# Altium footprint library 3.22-杂项.PcbLib: 985 footprints (part 40 of 64)
Each footprint in its own frame and in the unit in brackets; x right, y up, seen from the top. Pads: shape width x height; smd on the part's side, far side on the other; paste and mask are expansions set on the pad; w line width, h text height; cw(c..) or ccw(c..) is an arc to the next point about the centre after c.
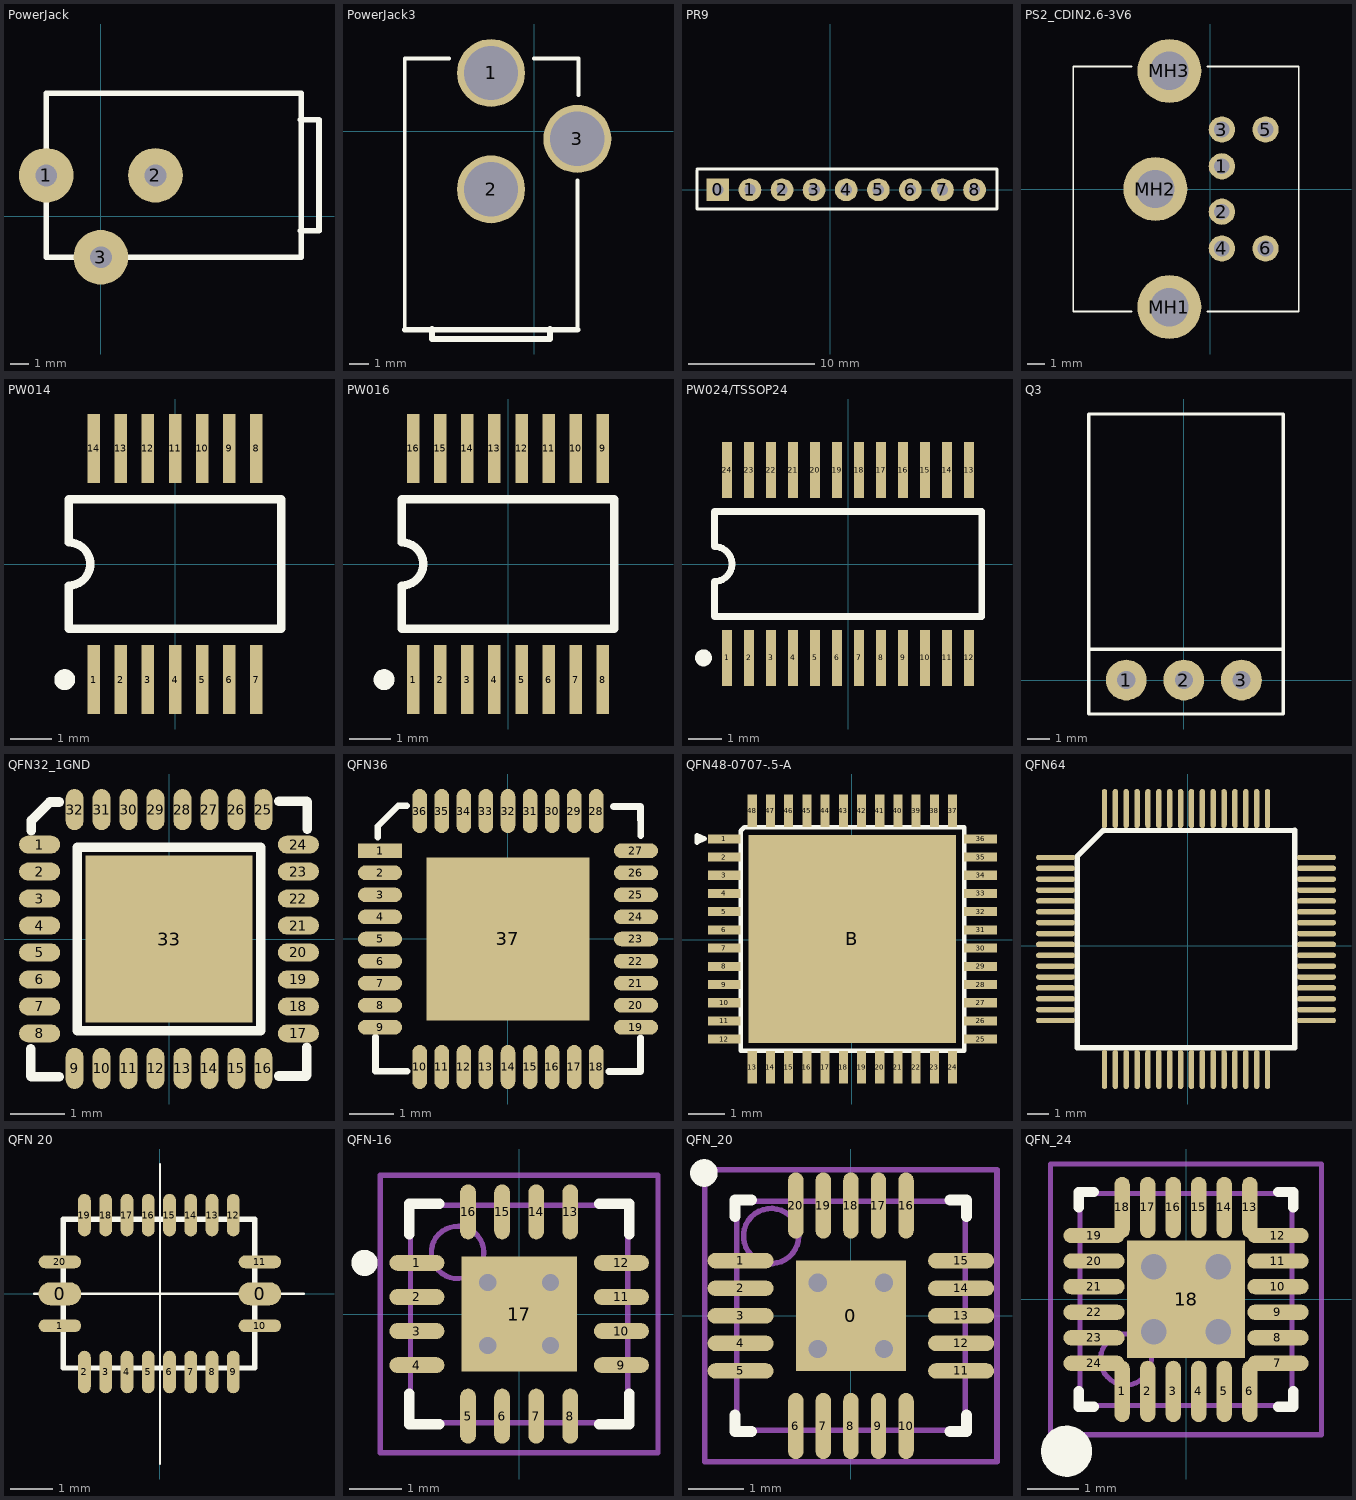
[diagram p39: the footprints below, top view; thin cyan lines are the x and y axes]

## PowerJack [mm] "PowerJack"
pads (3):
  round 3 hole 1.2: 1(-3,2.25) 2(3,2.25) 3(0,-2.25)
Top Overlay:
  lines w0.203: 10.97,0.726 10.97,5.298
  lines w0.305: 10.97,-0.798 11.986,-0.798 11.986,5.298 10.97,5.298 ; -3,-2.25 11,-2.25 11,6.75 -3,6.75 -3,-2.25

## PowerJack3 [mm] "14mm长，8.9mm宽，2.54焊盘，2与3脚相连为-"
pads (3):
  round 3.5 hole 2.8: 1(-2.225,3) 2(-2.225,-3) 3(2.225,-0.4)
Top Overlay:
  lines w0.2: -6.675,-10.238 -6.675,3.75 ; -6.613,3.75 -4.379,3.75 ; -0.009,3.75 2.225,3.75 ; 2.225,-10.238 2.225,-2.55 ; 2.291,1.85 2.291,3.75
  lines w0.305: -6.675,-10.238 2.225,-10.238 ; -5.273,-10.208 -5.273,-10.716 0.823,-10.716 0.823,-10.208

## PR9 [mm]
pads (9):
  rect 1.8x1.8 hole 0.9: 0(-8.89,0)
  round 1.8 hole 0.9: 1(-6.35,0) 2(-3.81,0) 3(-1.27,0) 4(1.27,0) 5(3.81,0) 6(6.35,0) 7(8.89,0) 8(11.43,0)
Top Overlay:
  lines w0.254: -10.541,1.524 -10.541,-1.524 13.208,-1.524 13.208,1.651 -10.541,1.651

## PS2_CDIN2.6-3V6 [mm] "Connector; Circular DIN, Thru-Hole; 6 Position; Right Angle; Pitch 2.1/2.6 mm; Body 14 x 12.9 x 13 mm (WxTxH)"
pads (9):
  round 1.5 hole 0.9: 1(0.65,1.3) 2(0.65,-1.3) 3(0.65,3.4) 4(0.65,-3.4) 5(3.15,3.4) 6(3.15,-3.4)
  round 3.65 hole 2.2: MH1(-2.35,-6.75) MH2(-3.15,0) MH3(-2.35,6.75)
Top Overlay:
  lines w0.1: -4.51,-7 -7.85,-7 -7.85,7 -4.51,7 ; -0.19,-7 5.05,-7 5.05,7 -0.19,7

## PW014 [mm] "Shrink Small Outline; 14 Leads; Body Width 4.4 mm; Pitch 0.65 mm TI库（tlv320aic23b）"
height 1.2
pads (14):
  rect 0.3x1.65 smd: 1(-1.95,-2.775) 2(-1.3,-2.775) 3(-0.65,-2.775) 4(0,-2.775) 5(0.65,-2.775) 6(1.3,-2.775) 7(1.95,-2.775) 8(1.95,2.775) 9(1.3,2.775) 10(0.65,2.775) 11(0,2.775) 12(-0.65,2.775) 13(-1.3,2.775) 14(-1.95,2.775)
Top Overlay:
  circle w0.25: c-2.65,-2.775 r0.125
  lines w0.2: -2.55,-1.55 -2.55,-0.517 ccw(c-2.55,0) -2.55,0.517 -2.55,1.55 2.55,1.55 2.55,-1.55 -2.55,-1.55

## PW016 [mm] "Shrink Small Outline; 16 Leads; Body Width 4.4 mm; Pitch 0.65 mm"
height 1.2
pads (16):
  rect 0.3x1.65 smd: 1(-2.275,-2.775) 2(-1.625,-2.775) 3(-0.975,-2.775) 4(-0.325,-2.775) 5(0.325,-2.775) 6(0.975,-2.775) 7(1.625,-2.775) 8(2.275,-2.775) 9(2.275,2.775) 10(1.625,2.775) 11(0.975,2.775) 12(0.325,2.775) 13(-0.325,2.775) 14(-0.975,2.775) 15(-1.625,2.775) 16(-2.275,2.775)
Top Overlay:
  circle w0.25: c-2.975,-2.775 r0.125
  lines w0.2: -2.55,-1.55 -2.55,-0.517 ccw(c-2.55,0) -2.55,0.517 -2.55,1.55 2.55,1.55 2.55,-1.55 -2.55,-1.55

## PW024/TSSOP24 [mm] "Shrink Small Outline; 24 Leads; Body Width 4.4 mm; Pitch 0.65 mm TI库(74LVC4245(LJ245A))"
height 1.2
pads (24):
  rect 0.3x1.65 smd: 1(-3.575,-2.775) 2(-2.925,-2.775) 3(-2.275,-2.775) 4(-1.625,-2.775) 5(-0.975,-2.775) 6(-0.325,-2.775) 7(0.325,-2.775) 8(0.975,-2.775) 9(1.625,-2.775) 10(2.275,-2.775) 11(2.925,-2.775) 12(3.575,-2.775) 13(3.575,2.775) 14(2.925,2.775) 15(2.275,2.775) 16(1.625,2.775) 17(0.975,2.775) 18(0.325,2.775) 19(-0.325,2.775) 20(-0.975,2.775) 21(-1.625,2.775) 22(-2.275,2.775) 23(-2.925,2.775) 24(-3.575,2.775)
Top Overlay:
  circle w0.25: c-4.275,-2.775 r0.125
  lines w0.2: -3.95,-1.55 -3.95,-0.517 ccw(c-3.95,0) -3.95,0.517 -3.95,1.55 3.95,1.55 3.95,-1.55 -3.95,-1.55

## Q3 [mm]
pads (3):
  round 1.8 hole 0.8: 1(-2.54,0) 2(0,0) 3(2.54,0)
Top Overlay:
  lines w0.152: -4.204,1.359 4.369,1.359 4.381,1.372 ; -4.191,-1.486 -4.191,11.735 4.394,11.735 4.394,-1.499 -4.178,-1.499 -4.191,-1.486

## QFN32_1GND [mil]
pads (33):
  oval 30x13 smd: 1(-94.5,68.92) 2(-94.5,49.23) 3(-94.5,29.54) 4(-94.5,9.85) 5(-94.5,-9.85) 6(-94.5,-29.54) 7(-94.5,-49.23) 8(-94.5,-68.92) 17(94.5,-68.92) 18(94.5,-49.23) 19(94.5,-29.54) 20(94.5,-9.85) 21(94.5,9.85) 22(94.5,29.54) 23(94.5,49.23) 24(94.5,68.92)
  oval 13x30 smd: 9(-68.92,-94.5) 10(-49.23,-94.5) 11(-29.54,-94.5) 12(-9.85,-94.5) 13(9.85,-94.5) 14(29.54,-94.5) 15(49.23,-94.5) 16(68.92,-94.5) 25(68.92,94.5) 26(49.23,94.5) 27(29.54,94.5) 28(9.85,94.5) 29(-9.85,94.5) 30(-29.54,94.5) 31(-49.23,94.5) 32(-68.92,94.5)
  rect 122.05x122.05 smd: 33(0,0)
Top Overlay:
  lines w7: -101,-80 -101,-100 -100.5,-100.5 -80,-100.5 ; -100.5,79 -100.5,86.5 -87,100 -80,100 ; 80,-100 100,-100 100.5,-99.5 100.5,-79 ; 80,100.5 100.5,100.5 101,100 101,80 ; -67,-67 67,-67 67,67 -67,67 -67,-67

## QFN36 [mm]
pads (37):
  rect 1x0.33 smd: 1(-2.898,2)
  oval 1x0.33 smd: 2(-2.898,1.5) 3(-2.898,1) 4(-2.898,0.5) 5(-2.898,0) 6(-2.898,-0.5) 7(-2.898,-1) 8(-2.898,-1.5) 9(-2.898,-2) 19(2.898,-2) 20(2.898,-1.5) 21(2.898,-1) 22(2.898,-0.5) 23(2.898,0) 24(2.898,0.5) 25(2.898,1) 26(2.898,1.5) 27(2.898,2)
  oval 0.33x1 smd: 10(-2,-2.898) 11(-1.5,-2.898) 12(-1,-2.898) 13(-0.5,-2.898) 14(0,-2.898) 15(0.5,-2.898) 16(1,-2.898) 17(1.5,-2.898) 18(2,-2.898) 28(2,2.898) 29(1.5,2.898) 30(1,2.898) 31(0.5,2.898) 32(0,2.898) 33(-0.5,2.898) 34(-1,2.898) 35(-1.5,2.898) 36(-2,2.898)
  rect 3.7x3.7 smd: 37(0,0)
Top Overlay:
  lines w0.152: -3,-2.219 -3,-2.994 -2.287,-2.994 ; -2.952,2.302 -2.952,2.554 -2.486,3.02 -2.294,3.02 ; 2.284,-3 3,-3 3,-2.24 ; 2.391,3 3,3 3.009,2.345

## QFN48-0707-.5-A [mm]
pads (49):
  rect 0.9x0.25 smd: 1(-3.496,2.772) 2(-3.496,2.272) 3(-3.496,1.772) 4(-3.496,1.272) 5(-3.496,0.772) 6(-3.496,0.272) 7(-3.496,-0.228) 8(-3.496,-0.728) 9(-3.496,-1.228) 10(-3.496,-1.728) 11(-3.496,-2.228) 12(-3.496,-2.728) 25(3.544,-2.728) 26(3.544,-2.228) 27(3.544,-1.728) 28(3.544,-1.228) 29(3.544,-0.728) 30(3.544,-0.228) 31(3.544,0.272) 32(3.544,0.772) 33(3.544,1.272) 34(3.544,1.772) 35(3.544,2.272) 36(3.544,2.772)
  rect 0.25x0.9 smd: 13(-2.726,-3.498) 14(-2.226,-3.498) 15(-1.726,-3.498) 16(-1.226,-3.498) 17(-0.726,-3.498) 18(-0.226,-3.498) 19(0.274,-3.498) 20(0.774,-3.498) 21(1.274,-3.498) 22(1.774,-3.498) 23(2.274,-3.498) 24(2.774,-3.498) 37(2.774,3.542) 38(2.274,3.542) 39(1.774,3.542) 40(1.274,3.542) 41(0.774,3.542) 42(0.274,3.542) 43(-0.226,3.542) 44(-0.726,3.542) 45(-1.226,3.542) 46(-1.726,3.542) 47(-2.226,3.542) 48(-2.726,3.542)
  rect 5.7x5.7 smd: B(0.024,0.022)
Top Overlay:
  lines w0.127: -4.243,2.672 -4.243,2.872 -4.031,2.779 -4.039,2.775 -4.243,2.672 ; -3.046,-3.048 3.094,-3.048 3.094,3.092 -2.946,3.092 -3.046,2.992 -3.046,-3.048

## QFN64 [mm]
pads (64):
  oval 1.8x0.25 smd: 1(-6.085,4.052) 2(-6.085,3.552) 3(-6.085,3.052) 4(-6.085,2.552) 5(-6.085,2.052) 6(-6.085,1.552) 7(-6.085,1.052) 8(-6.085,0.552) 9(-6.085,0.052) 10(-6.085,-0.448) 11(-6.085,-0.948) 12(-6.085,-1.448) 13(-6.085,-1.948) 14(-6.085,-2.448) 15(-6.085,-2.948) 16(-6.085,-3.448) 33(5.915,-3.448) 34(5.915,-2.948) 35(5.915,-2.448) 36(5.915,-1.948) 37(5.915,-1.448) 38(5.915,-0.948) 39(5.915,-0.448) 40(5.915,0.052) 41(5.915,0.552) 42(5.915,1.052) 43(5.915,1.552) 44(5.915,2.052) 45(5.915,2.552) 46(5.915,3.052) 47(5.915,3.552) 48(5.915,4.052)
  oval 0.25x1.8 smd: 17(-3.835,-5.698) 18(-3.335,-5.698) 19(-2.835,-5.698) 20(-2.335,-5.698) 21(-1.835,-5.698) 22(-1.335,-5.698) 23(-0.835,-5.698) 24(-0.335,-5.698) 25(0.165,-5.698) 26(0.665,-5.698) 27(1.165,-5.698) 28(1.665,-5.698) 29(2.165,-5.698) 30(2.665,-5.698) 31(3.165,-5.698) 32(3.665,-5.698) 49(3.665,6.302) 50(3.165,6.302) 51(2.665,6.302) 52(2.165,6.302) 53(1.665,6.302) 54(1.165,6.302) 55(0.665,6.302) 56(0.165,6.302) 57(-0.335,6.302) 58(-0.835,6.302) 59(-1.335,6.302) 60(-1.835,6.302) 61(-2.335,6.302) 62(-2.835,6.302) 63(-3.335,6.302) 64(-3.835,6.302)
Top Overlay:
  lines w0.254: -5.085,-4.698 -5.085,4.112 -3.89,5.307 -3.89,5.292 4.915,5.302 4.915,-4.698 -5.085,-4.698

## QFN 20 [mm]
height 1
pads (22):
  oval 1x0.54 smd paste+0 mask+0.05: 0(-2.35,-0.006) 0(2.35,-0.006)
  oval 1x0.3 smd paste+0 mask+0.05: 1(-2.35,-0.756) 10(2.35,-0.756) 11(2.35,0.744) 20(-2.35,0.744)
  oval 0.3x1 smd paste+0 mask+0.05: 2(-1.775,-1.844) 3(-1.275,-1.844) 4(-0.775,-1.844) 5(-0.275,-1.844) 6(0.225,-1.844) 7(0.725,-1.844) 8(1.225,-1.844) 9(1.725,-1.844) 12(1.725,1.844) 13(1.225,1.844) 14(0.725,1.844) 15(0.225,1.844) 16(-0.275,1.844) 17(-0.775,1.844) 18(-1.275,1.844) 19(-1.775,1.844)
Top Overlay:
  lines w0.051: -2.961,-0.006 3.389,-0.006 ; 0,-4.006 0,3.044
  lines w0.127: -2.275,-1.751 -2.275,1.749 2.225,1.749 2.225,-1.751 -2.275,-1.751

## QFN-16 [mm] "QFN"
height 0.8
pads (17):
  oval 1.05x0.3 smd: 1(-1.95,0.975) 2(-1.95,0.325) 3(-1.95,-0.325) 4(-1.95,-0.975) 9(1.95,-0.975) 10(1.95,-0.325) 11(1.95,0.325) 12(1.95,0.975)
  oval 0.3x1.05 smd: 5(-0.975,-1.95) 6(-0.325,-1.95) 7(0.325,-1.95) 8(0.975,-1.95) 13(0.975,1.95) 14(0.325,1.95) 15(-0.325,1.95) 16(-0.975,1.95)
  rect 2.2x2.2 smd: 17(0,0)
via -0.6,0.6 diameter 0.66 hole 0.33
via 0.6,0.6 diameter 0.66 hole 0.33
via -0.6,-0.6 diameter 0.66 hole 0.33
via 0.6,-0.6 diameter 0.66 hole 0.33
Top Overlay:
  circle w0.25: c-2.95,0.975 r0.125
  lines w0.2: -2.1,-1.525 -2.1,-2.1 -1.525,-2.1 ; -2.1,1.525 -2.1,2.1 -1.525,2.1 ; 1.525,-2.1 2.1,-2.1 2.1,-1.525 ; 1.525,2.1 2.1,2.1 2.1,1.525
Mechanical 13:
  circle w0.1: c-1.175,1.175 r0.5
  lines w0.1: -2.075,-2.075 -2.075,2.075 2.075,2.075 2.075,-2.075 -2.075,-2.075
Mechanical 15:
  lines w0.1: -0.5,0 0.5,0 ; 0,-0.5 0,0.5 ; -2.65,-2.65 -2.65,2.65 2.65,2.65 2.65,-2.65 -2.65,-2.65
3D body: height 0.8, standoff 0, extent -2.075,-2.075 2.075,2.075

## QFN_20 [mm]
pads (21):
  rect 2x2 smd: 0(0,0)
  oval 1.2x0.28 smd: 1(-2,1) 2(-2,0.5) 3(-2,0) 4(-2,-0.5) 5(-2,-1) 11(2,-1) 12(2,-0.5) 13(2,0) 14(2,0.5) 15(2,1)
  oval 0.28x1.2 smd: 6(-1,-2) 7(-0.5,-2) 8(0,-2) 9(0.5,-2) 10(1,-2) 16(1,2) 17(0.5,2) 18(0,2) 19(-0.5,2) 20(-1,2)
via 0.6,0.6 diameter 0.66 hole 0.33
via 0.6,-0.6 diameter 0.66 hole 0.33
via -0.6,0.6 diameter 0.66 hole 0.33
via -0.6,-0.6 diameter 0.66 hole 0.33
Top Overlay:
  circle w0.25: c-2.667,2.591 r0.125
  lines w0.2: -2.1,-1.8 -2.1,-2.1 -1.8,-2.1 ; -2.1,1.8 -2.1,2.1 -1.8,2.1 ; 1.8,-2.1 2.1,-2.1 2.1,-1.8 ; 1.8,2.1 2.1,2.1 2.1,1.8
Mechanical 13:
  circle w0.1: c-1.448,1.448 r0.5
  lines w0.1: -2.075,-2.075 -2.075,2.075 2.075,2.075 2.075,-2.075 -2.075,-2.075
Mechanical 15:
  lines w0.1: -0.5,0 0.5,0 ; 0,-0.5 0,0.5 ; -2.65,-2.65 -2.65,2.65 2.65,2.65 2.65,-2.65 -2.65,-2.65
3D body: height 1, standoff 0, extent -2.075,-2.075 2.075,2.075

## QFN_24 [mm]
pads (25):
  oval 0.3x1.2 smd: 1(-1.25,-1.8) 2(-0.75,-1.8) 3(-0.25,-1.8) 4(0.25,-1.8) 5(0.75,-1.8) 6(1.25,-1.8) 13(1.25,1.8) 14(0.75,1.8) 15(0.25,1.8) 16(-0.25,1.8) 17(-0.75,1.8) 18(-1.25,1.8)
  oval 1.2x0.3 smd: 7(1.8,-1.25) 8(1.8,-0.75) 9(1.8,-0.25) 10(1.8,0.25) 11(1.8,0.75) 12(1.8,1.25) 19(-1.8,1.25) 20(-1.8,0.75) 21(-1.8,0.25) 22(-1.8,-0.25) 23(-1.8,-0.75) 24(-1.8,-1.25)
  rect 2.3x2.3 smd: 18(0,0)
via -0.635,0.635 diameter 0.7 hole 0.5
via 0.635,0.635 diameter 0.7 hole 0.5
via 0.635,-0.635 diameter 0.7 hole 0.5
via -0.635,-0.635 diameter 0.7 hole 0.5
Top Overlay:
  circle w0.5: c-2.337,-2.972 r0.25
  lines w0.2: -2.1,-1.8 -2.1,-2.1 -1.8,-2.1 ; -2.1,1.8 -2.1,2.1 -1.8,2.1 ; 1.8,-2.1 2.1,-2.1 2.1,-1.8 ; 1.8,2.1 2.1,2.1 2.1,1.8
Mechanical 13:
  circle w0.1: c-1.175,-1.175 r0.5
  lines w0.1: -2.075,-2.075 -2.075,2.075 2.075,2.075 2.075,-2.075 -2.075,-2.075
Mechanical 15:
  lines w0.1: -0.5,0 0.5,0 ; 0,-0.5 0,0.5 ; -2.65,-2.65 -2.65,2.65 2.65,2.65 2.65,-2.65 -2.65,-2.65
3D body: height 1, standoff 0, extent -2.075,-2.075 2.075,2.075